# Altium footprint library Generic Footprint.PcbLib: 160 footprints (part 19 of 20)
Each footprint in its own frame and in the unit in brackets; x right, y up, seen from the top. Pads: shape width x height; smd on the part's side, far side on the other; paste and mask are expansions set on the pad; w line width, h text height; cw(c..) or ccw(c..) is an arc to the next point about the centre after c.
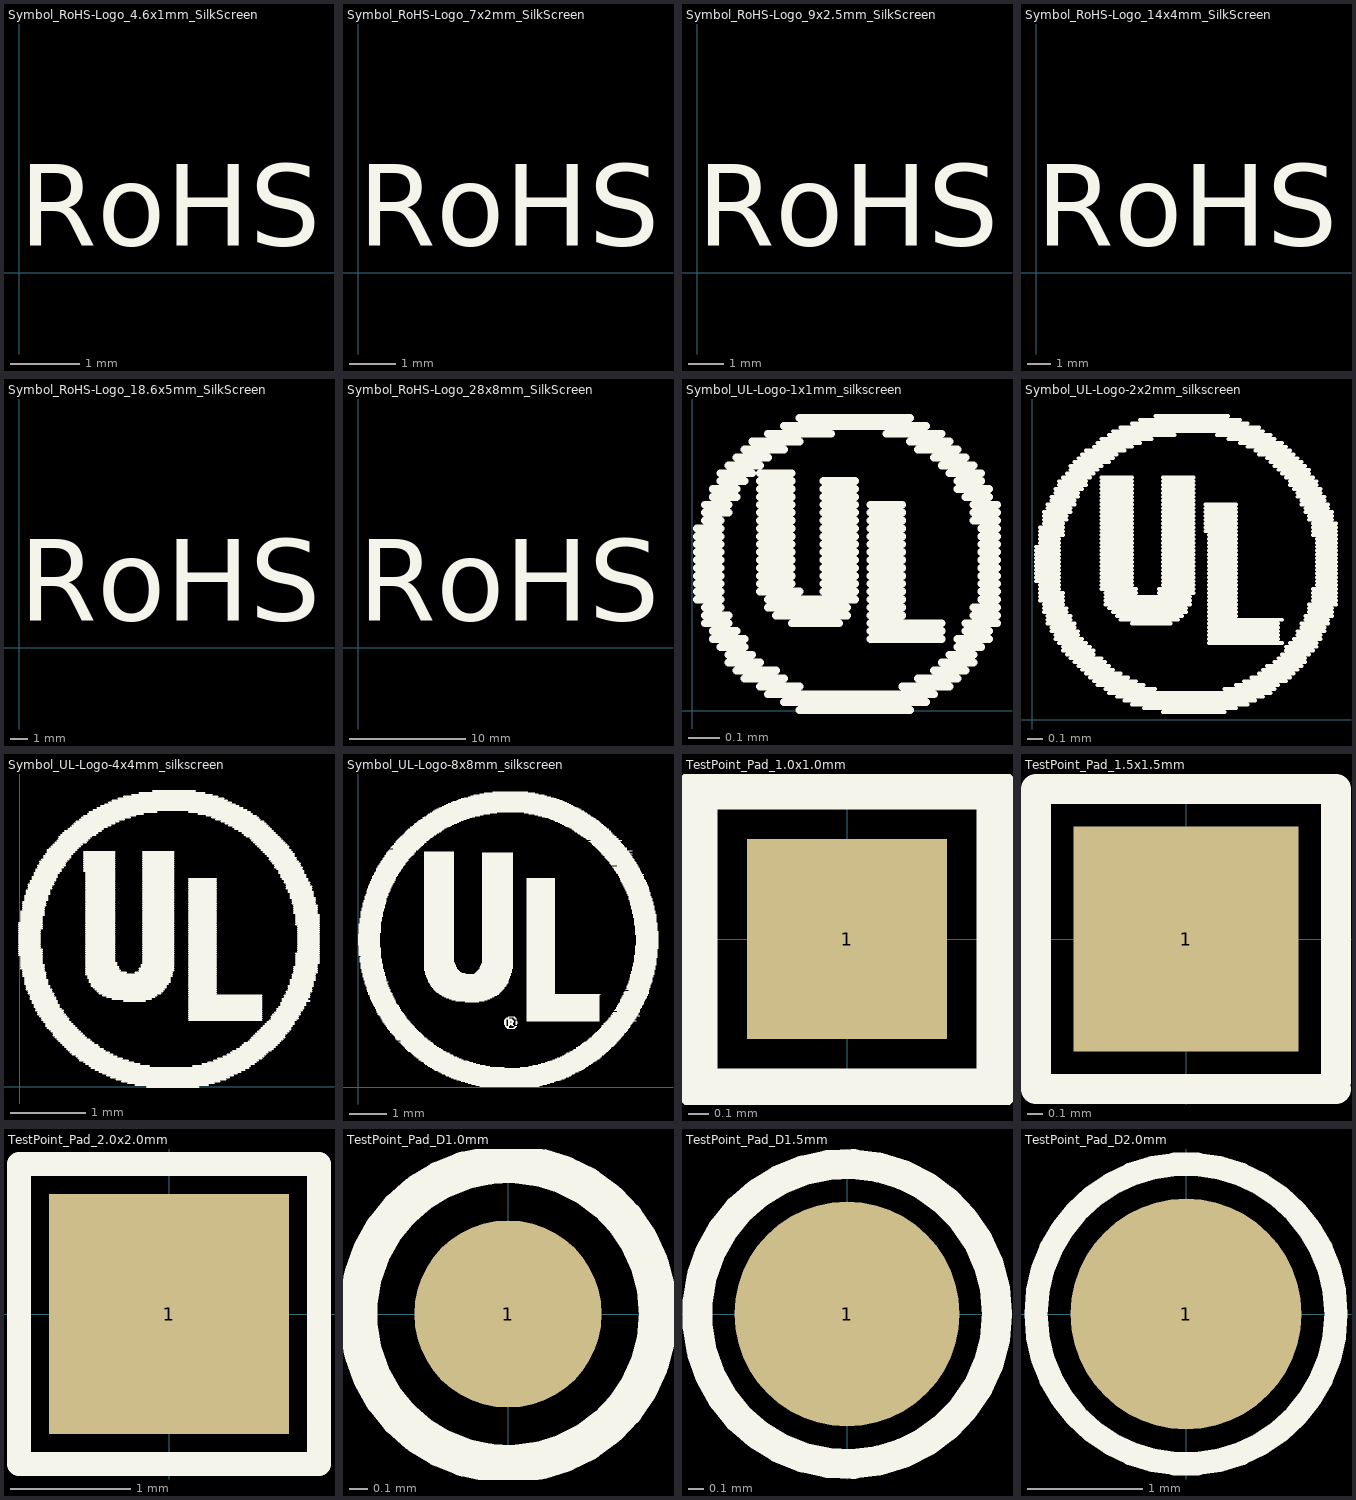
[diagram p18: the footprints below, top view; thin cyan lines are the x and y axes]

## Symbol_RoHS-Logo_4.6x1mm_SilkScreen [mm]
Top Overlay:
  text "RoHS" at 0,0 h2

## Symbol_RoHS-Logo_7x2mm_SilkScreen [mm]
Top Overlay:
  text "RoHS" at 0,0 h3

## Symbol_RoHS-Logo_9x2.5mm_SilkScreen [mm]
Top Overlay:
  text "RoHS" at 0,0 h4

## Symbol_RoHS-Logo_14x4mm_SilkScreen [mm]
Top Overlay:
  text "RoHS" at 0,0 h6

## Symbol_RoHS-Logo_18.6x5mm_SilkScreen [mm]
Top Overlay:
  text "RoHS" at 0,0 h8

## Symbol_RoHS-Logo_28x8mm_SilkScreen [mm]
Top Overlay:
  text "RoHS" at 0,0 h12

## Symbol_UL-Logo-1x1mm_silkscreen [mm]
Top Overlay:
  lines w0.025: 0.015,0.357 0.091,0.357 ; 0.015,0.383 0.091,0.383 ; 0.015,0.408 0.091,0.408 ; 0.015,0.434 0.091,0.434 ; 0.015,0.459 0.091,0.459 ; 0.015,0.484 0.091,0.484 ; 0.015,0.51 0.091,0.51 ; 0.015,0.535 0.091,0.535 ; 0.015,0.561 0.091,0.561 ; 0.015,0.586 0.091,0.586 ; 0.04,0.281 0.116,0.281 ; 0.04,0.307 0.116,0.307 ; 0.04,0.332 0.091,0.332 ; 0.04,0.611 0.091,0.611 ; 0.04,0.637 0.116,0.637 ; 0.04,0.662 0.116,0.662 ; 0.066,0.23 0.167,0.23 ; 0.066,0.256 0.142,0.256 ; 0.066,0.688 0.142,0.688 ; 0.066,0.713 0.142,0.713 ; 0.091,0.205 0.167,0.205 ; 0.091,0.738 0.167,0.738 ; 0.091,0.764 0.193,0.764 ; 0.116,0.154 0.218,0.154 ; 0.116,0.18 0.193,0.18 ; 0.116,0.789 0.218,0.789 ; 0.142,0.129 0.269,0.129 ; 0.142,0.815 0.243,0.815 ; 0.167,0.103 0.294,0.103 ; 0.167,0.84 0.294,0.84 ; 0.193,0.865 0.345,0.865 ; 0.218,0.078 0.345,0.078 ; 0.218,0.383 0.345,0.383 ; 0.218,0.408 0.32,0.408 ; 0.218,0.434 0.32,0.434 ; 0.218,0.459 0.32,0.459 ; 0.218,0.484 0.32,0.484 ; 0.218,0.51 0.32,0.51 ; 0.218,0.535 0.32,0.535 ; 0.218,0.561 0.32,0.561 ; 0.218,0.586 0.32,0.586 ; 0.218,0.611 0.32,0.611 ; 0.218,0.637 0.32,0.637 ; 0.218,0.662 0.32,0.662 ; 0.218,0.688 0.32,0.688 ; 0.218,0.713 0.32,0.713 ; 0.218,0.738 0.32,0.738 ; 0.218,0.764 0.32,0.764 ; 0.243,0.053 0.777,0.053 ; 0.243,0.332 0.497,0.332 ; 0.243,0.357 0.523,0.357 ; 0.243,0.891 0.447,0.891 ; 0.269,0.307 0.497,0.307 ; 0.294,0.027 0.751,0.027 ; 0.294,0.916 0.751,0.916 ; 0.32,0.281 0.472,0.281 ; 0.345,0.002 0.701,0.002 ; 0.345,0.942 0.701,0.942 ; 0.421,0.383 0.523,0.383 ; 0.421,0.408 0.523,0.408 ; 0.421,0.434 0.523,0.434 ; 0.421,0.459 0.523,0.459 ; 0.421,0.484 0.523,0.484 ; 0.421,0.51 0.523,0.51 ; 0.421,0.535 0.523,0.535 ; 0.421,0.561 0.523,0.561 ; 0.421,0.586 0.523,0.586 ; 0.421,0.611 0.523,0.611 ; 0.421,0.637 0.523,0.637 ; 0.421,0.662 0.523,0.662 ; 0.421,0.688 0.523,0.688 ; 0.421,0.713 0.523,0.713 ; 0.421,0.738 0.523,0.738 ; 0.574,0.23 0.802,0.23 ; 0.574,0.256 0.802,0.256 ; 0.574,0.281 0.802,0.281 ; 0.574,0.307 0.675,0.307 ; 0.574,0.332 0.675,0.332 ; 0.574,0.357 0.675,0.357 ; 0.574,0.383 0.675,0.383 ; 0.574,0.408 0.675,0.408 ; 0.574,0.434 0.675,0.434 ; 0.574,0.459 0.675,0.459 ; 0.574,0.484 0.675,0.484 ; 0.574,0.51 0.675,0.51 ; 0.574,0.535 0.675,0.535 ; 0.574,0.561 0.675,0.561 ; 0.574,0.586 0.675,0.586 ; 0.574,0.611 0.675,0.611 ; 0.574,0.637 0.675,0.637 ; 0.574,0.662 0.675,0.662 ; 0.624,0.891 0.802,0.891 ; 0.675,0.078 0.828,0.078 ; 0.701,0.865 0.828,0.865 ; 0.726,0.103 0.853,0.103 ; 0.726,0.84 0.853,0.84 ; 0.777,0.129 0.878,0.129 ; 0.777,0.815 0.878,0.815 ; 0.802,0.154 0.904,0.154 ; 0.802,0.789 0.904,0.789 ; 0.828,0.18 0.904,0.18 ; 0.828,0.764 0.929,0.764 ; 0.853,0.205 0.929,0.205 ; 0.853,0.23 0.955,0.23 ; 0.853,0.713 0.955,0.713 ; 0.853,0.738 0.929,0.738 ; 0.878,0.256 0.955,0.256 ; 0.878,0.281 0.98,0.281 ; 0.878,0.688 0.955,0.688 ; 0.904,0.307 0.98,0.307 ; 0.904,0.332 0.98,0.332 ; 0.904,0.611 0.98,0.611 ; 0.904,0.637 0.98,0.637 ; 0.904,0.662 0.98,0.662 ; 0.929,0.357 0.98,0.357 ; 0.929,0.383 0.98,0.383 ; 0.929,0.408 0.98,0.408 ; 0.929,0.434 0.98,0.434 ; 0.929,0.459 0.98,0.459 ; 0.929,0.484 0.98,0.484 ; 0.929,0.51 0.98,0.51 ; 0.929,0.535 0.98,0.535 ; 0.929,0.561 0.98,0.561 ; 0.929,0.586 0.98,0.586

## Symbol_UL-Logo-2x2mm_silkscreen [mm]
Top Overlay:
  drawing of 252 lines, arcs and shapes, not listed

## Symbol_UL-Logo-4x4mm_silkscreen [mm]
Top Overlay:
  drawing of 508 lines, arcs and shapes, not listed

## Symbol_UL-Logo-8x8mm_silkscreen [mm]
Top Overlay:
  drawing of 1049 lines, arcs and shapes, not listed

## TestPoint_Pad_1.0x1.0mm [mm]
pads (1):
  rect 1x1 smd: 1(0,0)
Top Overlay:
  lines w0.203: -0.75,-0.75 0.75,-0.75 0.75,0.75 -0.75,0.75 -0.75,-0.75

## TestPoint_Pad_1.5x1.5mm [mm]
pads (1):
  rect 1.5x1.5 smd: 1(0,0)
Top Overlay:
  lines w0.203: 1,-1 -1,-1 -1,1 1,1 1,-0.95

## TestPoint_Pad_2.0x2.0mm [mm]
pads (1):
  rect 2x2 smd: 1(0,0)
Top Overlay:
  lines w0.203: -1.25,-1.25 -1.25,1.25 1.25,1.25 1.25,-1.25 -1.25,-1.25

## TestPoint_Pad_D1.0mm [mm]
pads (1):
  round 1 smd: 1(0,0)
Top Overlay:
  circle w0.203: c0,0 r0.8

## TestPoint_Pad_D1.5mm [mm]
pads (1):
  round 1.5 smd: 1(0,0)
Top Overlay:
  circle w0.2: c0,0 r1

## TestPoint_Pad_D2.0mm [mm]
pads (1):
  round 2 smd: 1(0,0)
Top Overlay:
  circle w0.203: c0,0 r1.3